# Altium footprint library ATROTECH.PcbLib: 334 footprints (part 1 of 21)
Each footprint in its own frame and in the unit in brackets; x right, y up, seen from the top. Pads: shape width x height; smd on the part's side, far side on the other; paste and mask are expansions set on the pad; w line width, h text height; cw(c..) or ccw(c..) is an arc to the next point about the centre after c.
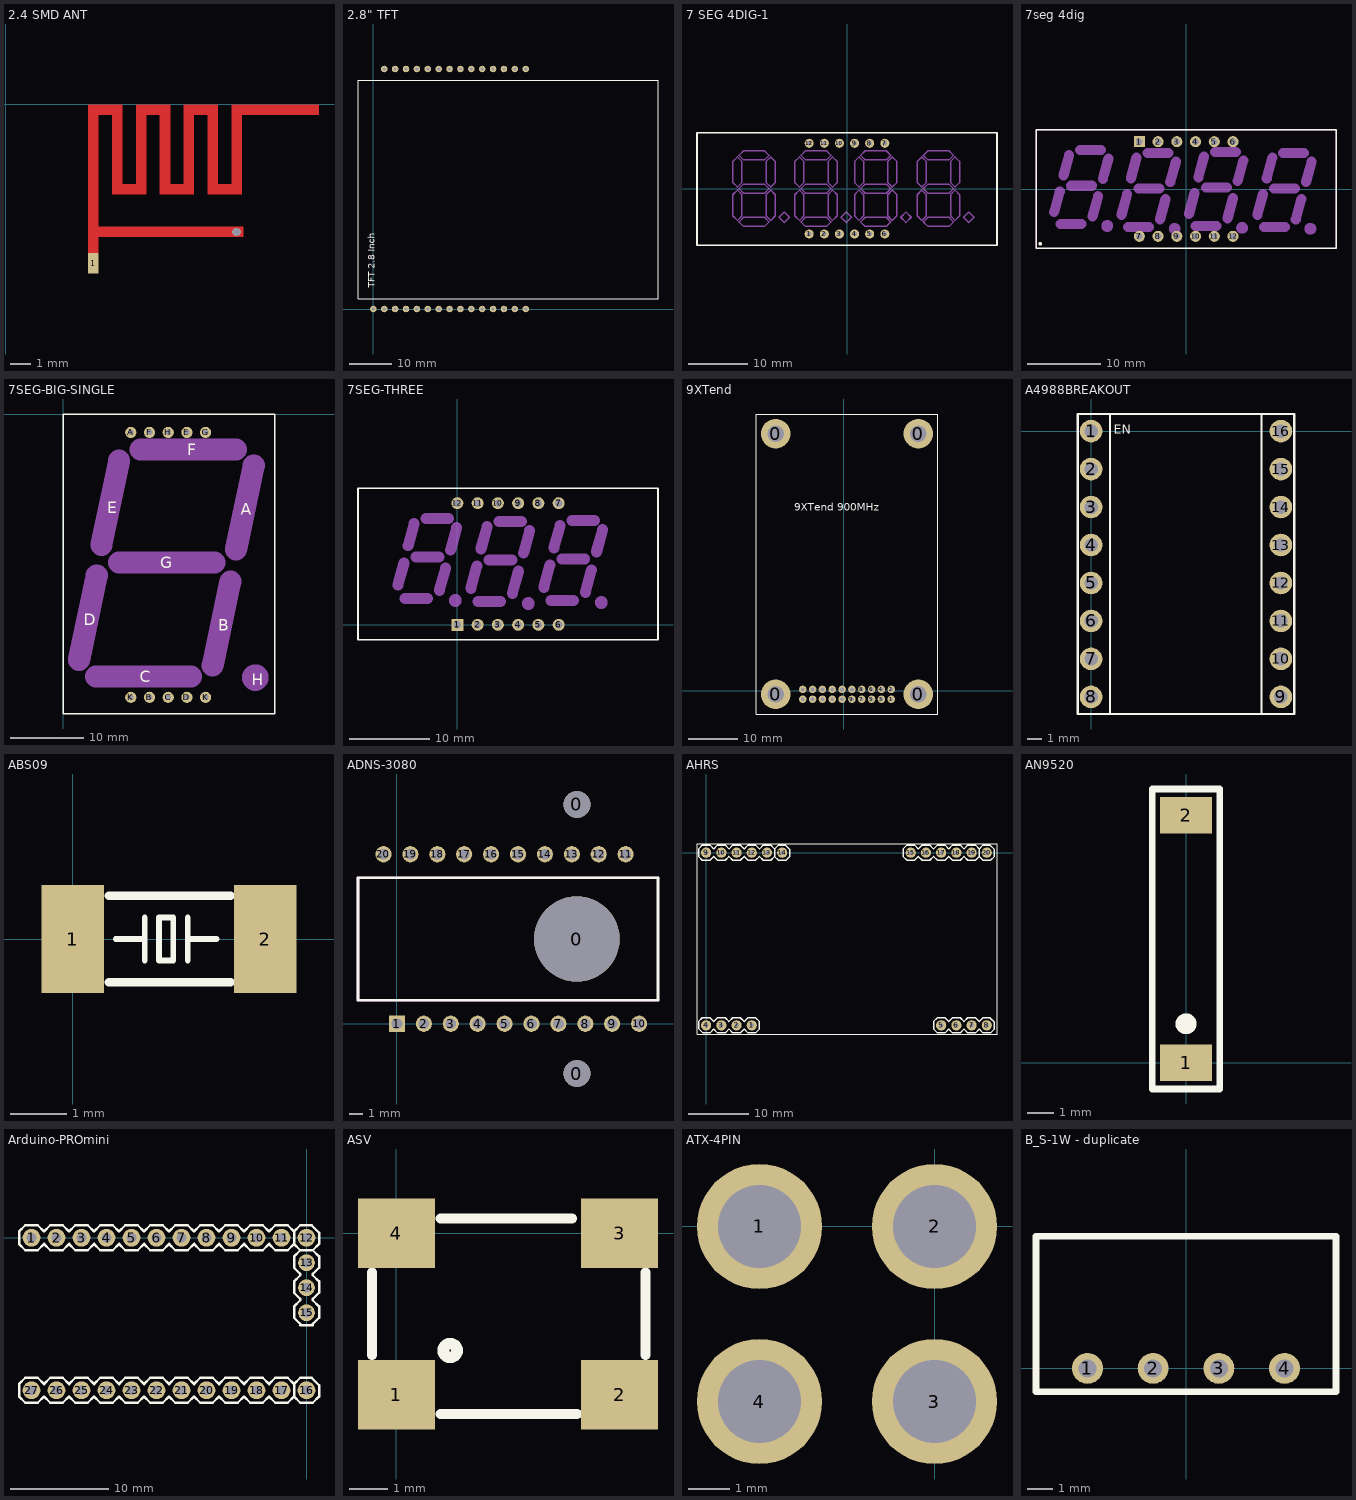
[diagram p0: the footprints below, top view; thin cyan lines are the x and y axes]

## 2.4 SMD ANT [mm]
pads (1):
  rect 0.508x1 smd: 1(4.191,-7.6)
via 11.049,-6.096 diameter 0.381 hole 0.381
Top Layer:
  rectangle: 10.795,-0.508 14.986,0
  rectangle: 8.509,-0.508 10.16,0
  region: 9.652,-0.508 9.652,-4.318 10.16,-4.318 10.16,-0.508
  rectangle: 9.652,-4.318 11.303,-3.81
  region: 10.795,-0.508 10.795,-4.318 11.303,-4.318 11.303,-0.508
  rectangle: 6.223,-0.508 7.874,0
  region: 7.366,-0.508 7.366,-4.318 7.874,-4.318 7.874,-0.508
  rectangle: 7.366,-4.318 9.017,-3.81
  region: 8.509,-0.508 8.509,-4.318 9.017,-4.318 9.017,-0.508
  region: 6.223,-0.508 6.223,-4.318 6.731,-4.318 6.731,-0.508
  rectangle: 5.08,-4.318 6.731,-3.81
  region: 5.08,-0.508 5.08,-4.318 5.588,-4.318 5.588,-0.508
  rectangle: 3.937,-0.508 5.588,0
  region: 4.445,-7.112 4.445,0 3.937,0 3.937,-7.112
  rectangle: 4.445,-6.35 11.379,-5.842

## 2.8" TFT [mil] "ECA TFT LCD"
pads (29):
  round 60 hole 30: 1(1300,0) 2(1400,0) 3(1100,0) 4(1200,0) 5(1000,0) 6(0,0) 7(800,0) 8(900,0) 9(600,0) 10(700,0) 11(400,0) 12(500,0) 13(200,0) 14(300,0) 15(100,2204.72) 16(100,0) 17(300,2204.72) 18(200,2204.72) 19(500,2204.72) 20(400,2204.72) 21(700,2204.72) 22(600,2204.72) 23(900,2204.72) 24(800,2204.72) 25(1100,2204.72) 26(1000,2204.72) 27(1200,2204.72) 29(1400,2204.72) 30(1300,2204.72)
Top Overlay:
  lines w10: -140.91,95 -140.91,2102.87 2615,2102.87 2615,95 -140.91,95
  text "TFT 2.8 Inch" at 15,195 h60

## 7 SEG 4DIG-1 [mil]
pads (13):
  round 60 hole 30: 1(-250,-300) 2(-150,-300) 3(-50,-300) 4(50,-300) 5(150,-300) 6(250,-300) 7(250,300) 8(150,300) 9(50,300) 10(-50,300) 11(-150,300) 12(-250,300) 12(-250,300)
Top Overlay:
  lines w10: -992.13,-374.02 -992.13,369.02 992.13,369.02 992.13,-374.02 -992.13,-374.02
Mechanical 1:
  drawing of 184 lines, arcs and shapes, not listed
  text "A" at -630,200 h39.37
  text "C" at -520,-135 h39.37
  text "D" at -625,-240 h39.37
  text "E" at -740,-135 h39.37
  text "F" at -735,85 h39.37
  text "B" at -520,85 h39.37
  text "G" at -630,-20 h39.37
  text "H" at -430,-210 h39.37
  text "H" at -20,-210 h39.37
  text "G" at -220,-20 h39.37
  text "B" at -110,85 h39.37
  text "F" at -325,85 h39.37
  text "E" at -330,-135 h39.37
  text "D" at -215,-240 h39.37
  text "C" at -110,-135 h39.37
  text "A" at -220,200 h39.37
  text "H" at 375,-210 h39.37
  text "G" at 175,-20 h39.37
  text "B" at 285,85 h39.37
  text "F" at 70,85 h39.37
  text "E" at 65,-135 h39.37
  text "D" at 180,-240 h39.37
  text "C" at 285,-135 h39.37
  text "A" at 175,200 h39.37
  text "H" at 790,-210 h39.37
  text "G" at 590,-20 h39.37
  text "B" at 700,85 h39.37
  text "F" at 485,85 h39.37
  text "E" at 480,-135 h39.37
  text "D" at 595,-240 h39.37
  text "C" at 700,-135 h39.37
  text "A" at 590,200 h39.37
3D body "4-Digit 7-Segment LED Display - Multiplexed.stp": height 330.45, standoff -264.04, extent -983.49,-374.01 985.03,374.02

## 7seg 4dig [mm]
pads (12):
  rect 1.5x1.5 hole 0.9: 1(-6.35,6.413)
  round 1.5 hole 0.9: 2(-3.81,6.413) 3(-1.27,6.413) 4(1.27,6.413) 5(3.81,6.413) 6(6.35,6.413) 7(-6.35,-6.413) 8(-3.81,-6.413) 9(-1.27,-6.413) 10(1.27,-6.413) 11(3.81,-6.413) 12(6.35,-6.413)
Top Overlay:
  circle w0.25: c-19.81,-7.429 r0.125
  lines w0.2: -20.37,-8.064 20.32,-8.064 20.32,8.064 -20.37,8.064 -20.37,-8.064
Mechanical 1:
  circle w1: c-10.71,-5.016 r0.296
  circle w1: c-1.566,-5.397 r0.296
  circle w1: c7.578,-5.271 r0.296
  circle w1: c16.849,-5.397 r0.296
  lines w1.37: -17.907,-3.111 -17.145,-0.318 ; -17.018,-4.763 -14.174,-4.763 ; -16.637,1.841 -15.875,4.635 ; -15.621,0.445 -12.777,0.445 ; -14.401,5.271 -11.557,5.271 ; -12.7,-3.746 -11.938,-0.953 ; -11.303,1.333 -10.541,4.127 ; -8.763,-3.492 -8.001,-0.699 ; -7.874,-5.143 -5.03,-5.143 ; -7.493,1.46 -6.731,4.255 ; -6.477,0.064 -3.633,0.064 ; -5.257,4.889 -2.413,4.889 ; -3.556,-4.127 -2.794,-1.333 ; -2.159,0.953 -1.397,3.746 ; 0.381,-3.365 1.143,-0.572 ; 1.27,-5.016 4.114,-5.016 ; 1.651,1.587 2.413,4.381 ; 2.667,0.191 5.511,0.191 ; 3.887,5.016 6.731,5.016 ; 5.588,-4 6.35,-1.206 ; 6.985,1.079 7.747,3.873 ; 9.652,-3.492 10.414,-0.699 ; 10.541,-5.143 13.385,-5.143 ; 10.922,1.46 11.684,4.255 ; 11.938,0.064 14.782,0.064 ; 13.158,4.889 16.002,4.889 ; 14.859,-4.127 15.621,-1.333 ; 16.256,0.953 17.018,3.746
Mechanical 13:
  lines w0.1: -20.37,-8.064 -20.37,8.064 20.32,8.064 20.32,-8.064 -20.37,-8.064
3D body: height 8.25, standoff 0, extent -20.32,-8.064 20.32,8.064

## 7SEG-BIG-SINGLE [mil] "big 7segment"
height 354.33
pads (10):
  round 60 hole 30: A(362.2,-98.43) B(462.2,-1515.75) C(562.2,-1515.75) D(662.2,-1515.75) E(662.2,-98.43) F(462.2,-98.43) G(762.2,-98.43) H(562.2,-98.43) K(362.2,-1515.75) K(762.2,-1515.75)
Top Overlay:
  lines w7.87: 0,-1605 1133.07,-1605 1133.07,0 0,0 0,-1605
  text "H" at 1010,-1450 h60
  text "G" at 520,-825 h60
  text "F" at 665,-220 h60
  text "E" at 235,-530 h60
  text "D" at 110,-1130 h60
  text "C" at 410,-1435 h60
  text "B" at 830,-1160 h60
  text "A" at 950,-540 h60
Mechanical 1:
  circle w118.11: c1028.35,-1410 r11.65
  lines w118.11: 85,-1315 180,-865 ; 175,-1405 685,-1405 ; 205,-700 300,-250 ; 300,-795 810,-795 ; 415,-190 925,-190 ; 800,-1345 895,-895 ; 925,-725 1020,-275

## 7SEG-THREE [mm]
pads (12):
  rect 1.5x1.5 hole 0.9: 1(0,0)
  round 1.5 hole 0.9: 2(2.54,0) 3(5.08,0) 4(7.62,0) 5(10.16,0) 6(12.7,0) 7(12.7,15.24) 8(10.16,15.24) 9(7.62,15.24) 10(5.08,15.24) 11(2.54,15.24) 12(0,15.24)
Top Overlay:
  lines w0.2: -12.45,-1.88 -12.45,17.12 25.15,17.12 25.15,-1.88 -12.45,-1.88
Mechanical 13:
  circle w1: c18.038,2.794 r0.296
  circle w1: c8.894,2.667 r0.296
  circle w1: c-0.25,3.048 r0.296
  lines w1.37: -7.447,4.953 -6.685,7.747 ; -6.558,3.302 -3.714,3.302 ; -6.177,9.906 -5.415,12.7 ; -5.161,8.509 -2.317,8.509 ; -3.941,13.335 -1.097,13.335 ; -2.24,4.318 -1.478,7.112 ; -0.843,9.398 -0.081,12.192 ; 1.697,4.572 2.459,7.366 ; 2.586,2.921 5.43,2.921 ; 2.967,9.525 3.729,12.319 ; 3.983,8.128 6.827,8.128 ; 5.203,12.954 8.047,12.954 ; 6.904,3.937 7.666,6.731 ; 8.301,9.017 9.063,11.811 ; 10.841,4.699 11.603,7.493 ; 11.73,3.048 14.574,3.048 ; 12.111,9.652 12.873,12.446 ; 13.127,8.255 15.971,8.255 ; 14.347,13.081 17.191,13.081 ; 16.048,4.064 16.81,6.858 ; 17.445,9.144 18.207,11.938
3D body "User Library-5631_w_o_color_jam.SLDPRT": height 8.1, standoff -5.5, extent -12.4,-1.8 25.2,17.2

## 9XTend [mil] "9XTend 900MHz RF Module"
height 196.85
pads (24):
  round 236.22 hole 129.92: 0(-545.2,-30) 0(-545.2,2056.61) 0(596.54,-30) 0(596.54,2056.61)
  round 60 hole 30: 1(380,-69.37) 2(380,9.37) 3(301.26,-69.37) 4(301.26,9.37) 5(222.52,-69.37) 6(222.52,9.37) 7(143.78,-69.37) 8(143.78,9.37) 9(65.04,-69.37) 10(65.04,9.37) 11(-13.7,-69.37) 12(-13.7,9.37) 13(-92.44,-69.37) 14(-92.44,9.37) 15(-171.18,-69.37) 16(-171.18,9.37) 17(-249.92,-69.37) 18(-249.92,9.37) 19(-328.66,-69.37) 20(-328.66,9.37)
Top Overlay:
  lines w10: -702.68,-187.48 754.02,-187.48 754.02,2214.09 -702.68,2214.09 -702.68,-187.48
  text "9XTend 900MHz" at -395,1440 h60

## A4988BREAKOUT [mm]
pads (16):
  round 1.51 hole 0.9: 1(0,0) 2(0,-2.54) 3(0,-5.08) 4(0,-7.62) 5(0,-10.16) 6(0,-12.7) 7(0,-15.24) 8(0,-17.78) 9(12.7,-17.78) 10(12.7,-15.24) 11(12.7,-12.7) 12(12.7,-10.16) 13(12.7,-7.62) 14(12.7,-5.08) 15(12.7,-2.54) 16(12.7,0)
Top Overlay:
  lines w0.15: 1.27,-18.898 1.27,1.143 ; 11.405,-18.923 11.405,1.143
  lines w0.152: -0.889,-18.923 -0.889,1.143 1.27,1.143 11.405,1.143 13.589,1.143 13.589,-18.923 -0.889,-18.923
  text "EN" at 1.524,-0.183 h0.61
3D body "User Library-Mendel 90 - stepstick A4998.step": height 10.62, standoff -0.78, extent -1.258,-19.027 13.984,1.293

## ABS09 [mm] "CRYSTAL"
pads (2):
  rect 1.1x1.9 smd: 1(0,0) 2(3.4,0)
Top Overlay:
  lines w0.1: 0.762,0 1.27,0 ; 1.27,-0.381 1.27,0 ; 1.27,0.381 1.27,0 ; 2.032,-0.381 2.032,0.381 2.032,0 2.54,0 ; 1.524,-0.381 1.524,0.381 1.778,0.381 1.778,-0.381 1.524,-0.381
  lines w0.15: 0.635,-0.762 2.794,-0.762 ; 0.635,0.762 2.794,0.762
3D body "User Library-ABS09.STEP": height 0.9, standoff 0, extent -0.409,-0.762 3.711,0.758

## ADNS-3080 [mil]
pads (23):
  round 78.74 hole 78.74: 0(526.77,-145.67) 0(526.77,641.73)
  round 250 hole 250: 0(526.77,248.03)
  rect 47.25x47.25 hole 31.5: 1(0,0)
  round 47.25 hole 31.5: 2(78.74,0) 3(157.48,0) 4(236.22,0) 5(314.96,0) 6(393.7,0) 7(472.44,0) 8(551.18,0) 9(629.92,0) 10(708.66,0) 11(669.29,496.06) 12(590.55,496.06) 13(511.81,496.06) 14(433.07,496.06) 15(354.33,496.06) 16(275.59,496.06) 17(196.85,496.06) 18(118.11,496.06) 19(39.37,496.06) 20(-39.37,496.06)
Top Overlay:
  lines w8: -113.98,68.9 -113.98,427.16 763.98,427.16 763.98,68.9 -113.98,68.9
Mechanical 16:
  lines w8: 763.98,68.9 -113.98,68.9 -113.98,427.16 763.98,427.16

## AHRS [mm]
pads (20):
  round 1.7 hole 0.762: 1(7.62,-28.829) 2(5.08,-28.829) 3(2.54,-28.829) 4(0,-28.829) 5(39.243,-28.829) 6(41.783,-28.829) 7(44.323,-28.829) 8(46.863,-28.829) 9(0,0) 10(2.54,0) 11(5.08,0) 12(7.62,0) 13(10.16,0) 14(12.7,0) 15(34.163,0) 16(36.703,0) 17(39.243,0) 18(41.783,0) 19(44.323,0) 20(46.863,0)
Top Overlay:
  drawing of 152 lines, arcs and shapes, not listed
3D body "IMU.step": height 16.18, standoff 2.21, extent -1.607,-30.251 48.393,1.626
3D body "6pin.STEP": height 8.5, standoff -2.09, extent -1.245,-1.346 13.995,1.194
3D body "6pin.STEP": height 8.5, standoff -2.09, extent 32.995,-1.245 48.235,1.295
3D body "4pin.STEP": height 8.5, standoff -2.09, extent -1.27,-30.15 8.89,-27.61
3D body "4pin.STEP": height 8.5, standoff -2.09, extent 38.024,-30.226 48.184,-27.686

## AN9520 [mm]
pads (2):
  rect 2x1.4 smd: 1(0,0) 2(0,9.5)
Top Overlay:
  circle w0.4: c0,1.5 r0.2
  lines w0.254: -1.3,-1 1.3,-1 1.3,10.5 -1.3,10.5 -1.3,-1
3D body "User Library-AN9520.step": height 1.05, standoff 0, extent -1.05,0.05 1.05,9.55

## Arduino-PROmini [mm]
pads (27):
  round 1.8 hole 1: 1(-27.94,0) 2(-25.4,0) 3(-22.86,0) 4(-20.32,0) 5(-17.78,0) 6(-15.24,0) 7(-12.7,0) 8(-10.16,0) 9(-7.62,0) 10(-5.08,0) 11(-2.54,0) 12(0,0) 16(0,-15.5) 17(-2.54,-15.5) 18(-5.08,-15.5) 19(-7.62,-15.5) 20(-10.16,-15.5) 21(-12.7,-15.5) 22(-15.24,-15.5) 23(-17.78,-15.5) 24(-20.32,-15.5) 25(-22.86,-15.5) 26(-25.4,-15.5) 27(-27.94,-15.5)
  round 1.7 hole 1: 13(0,-2.54) 14(0,-5.08) 15(0,-7.62)
Top Overlay:
  drawing of 197 lines, arcs and shapes, not listed
3D body "2pinheader.STEP": height 0.84, standoff -10.08, extent -24.13,-1.27 -19.05,1.27
3D body "2pinheader.STEP": height 0.84, standoff -10.08, extent -19.05,-1.27 -13.97,1.27
3D body "2pinheader.STEP": height 0.84, standoff -10.08, extent -13.97,-1.27 -8.89,1.27
3D body "2pinheader.STEP": height 0.84, standoff -10.08, extent -8.89,-1.27 -3.81,1.27
3D body "2pinheader.STEP": height 0.74, standoff -10.18, extent -3.81,-1.27 1.27,1.27
3D body "2pinheader.STEP": height 8.38, standoff -2.54, extent -1.34,-6.28 1.2,-1.2
3D body "2pinheader.STEP": height 0.84, standoff -10.08, extent -29.21,-1.27 -24.13,1.27
3D body "2pinheader.STEP": height 0.84, standoff -10.08, extent -29.21,-16.77 -24.13,-14.23
3D body "2pinheader.STEP": height 0.74, standoff -10.18, extent -3.81,-16.77 1.27,-14.23
3D body "2pinheader.STEP": height 0.84, standoff -10.08, extent -8.89,-16.77 -3.81,-14.23
3D body "2pinheader.STEP": height 0.84, standoff -10.08, extent -13.97,-16.77 -8.89,-14.23
3D body "2pinheader.STEP": height 0.84, standoff -10.08, extent -19.05,-16.77 -13.97,-14.23
3D body "2pinheader.STEP": height 0.84, standoff -10.08, extent -24.13,-16.77 -19.05,-14.23
3D body "2pinheader.STEP": height 8.38, standoff -2.54, extent -1.34,-8.84 1.2,-3.76

## ASV [mm] "OSC 5x7"
pads (4):
  rect 2x1.8 smd: 1(0,-4.2) 2(5.8,-4.2) 3(5.8,0) 4(0,0)
Top Overlay:
  circle w0.3: c1.397,-3.048 r0.18
  lines w0.254: -0.635,-3.175 -0.635,-1.016 ; 1.143,-4.699 4.699,-4.699 ; 1.143,0.381 4.572,0.381 ; 6.477,-3.175 6.477,-1.016
3D body "User Library-ASV-Oscil.STEP": height 1.8, standoff 0, extent -0.579,-4.699 6.421,0.381

## ATX-4PIN [mm]
pads (4):
  round 3 hole 2: 1(-4.2,0) 2(0,0) 3(0,-4.2) 4(-4.2,-4.2)
3D body "plug_cpu_power_female_4-pin.stEp": height 24.88, standoff 0, extent -8.059,-7.732 4.241,3.668
3D body: height 10, standoff -5, extent -5.183,-5.443 -3.191,-3.447
3D body: height 25, standoff -5, extent -0.992,-5.443 1,-3.447
3D body: height 10, standoff -5, extent -5.183,-0.998 -3.191,0.998
3D body: height 10, standoff -5, extent -0.992,-0.998 1,0.998

## B_S-1W - duplicate [mm]
pads (4):
  round 1.2 hole 0.7: 1(-3.81,0) 2(-1.27,0) 3(1.27,0) 4(3.81,0)
Top Overlay:
  lines w0.254: -5.8,-0.9 -5.8,5.1 5.8,5.1 5.8,-0.9 -5.8,-0.9